# Altium footprint library 自建库.PcbLib: 169 footprints (part 11 of 11)
Each footprint in its own frame and in the unit in brackets; x right, y up, seen from the top. Pads: shape width x height; smd on the part's side, far side on the other; paste and mask are expansions set on the pad; w line width, h text height; cw(c..) or ccw(c..) is an arc to the next point about the centre after c.
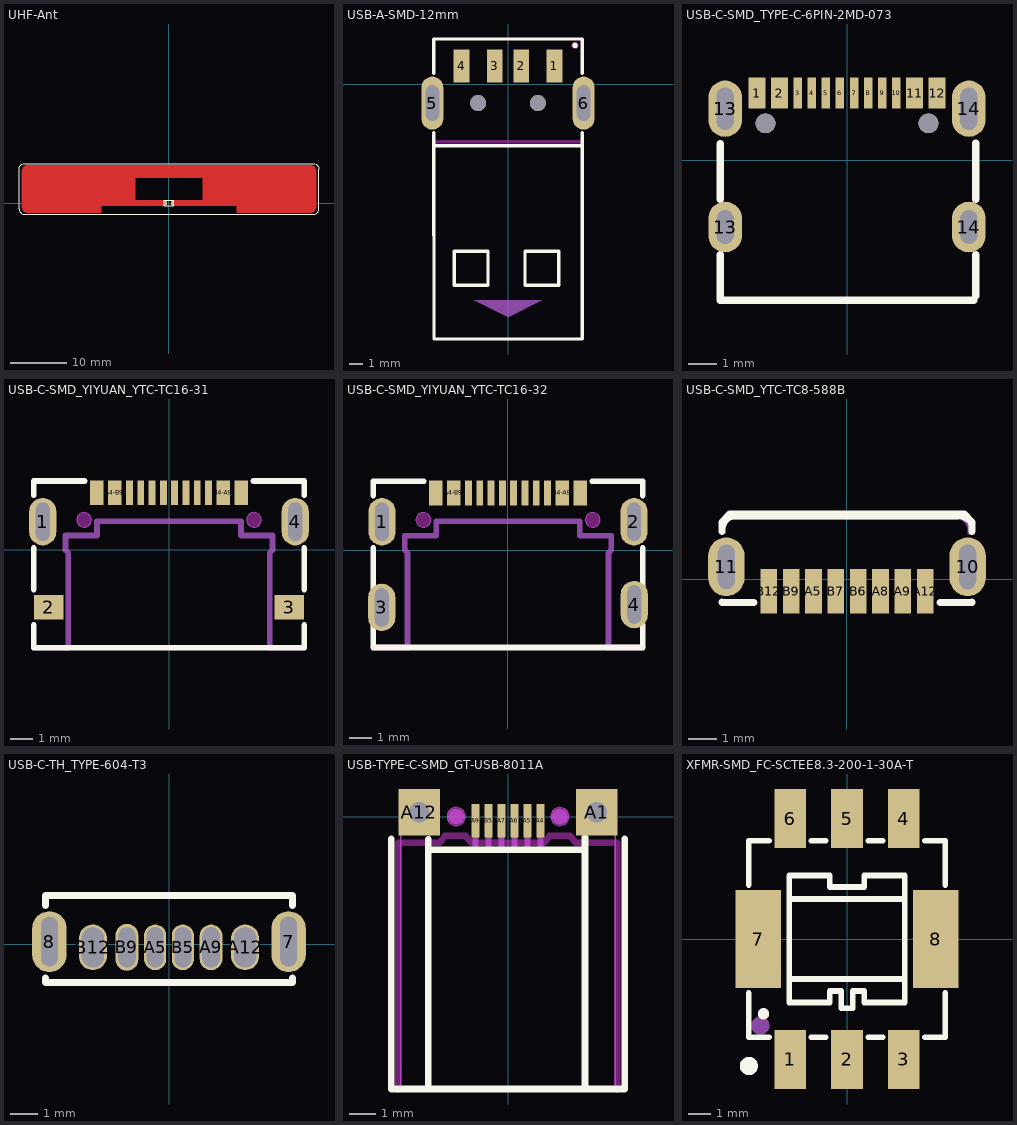
[diagram p10: the footprints below, top view; thin cyan lines are the x and y axes]

## UHF-Ant [mm] "超高频天线"
pads (2):
  oct 0.4x0.8 smd mask+0.102: 1(0.55,0)
  rect 0.4x0.8 smd mask+0.102: 2(-0.55,0)
Top Layer:
  region: 25.259,6.666 25.5,6.566 25.707,6.407 25.866,6.2 25.966,5.959 26,5.7 26,-0.7 25.966,-0.959 25.866,-1.2 25.707,-1.407 25.5,-1.566 25.259,-1.666 25,-1.7 12,-1.7 12,-0.5 0.4,-0.5 0.4,0.5 6,0.5 6,4.5 -6,4.5 -6,0.5 -0.4,0.5 -0.4,-0.5 -12,-0.5 -12,-1.7 -25,-1.7 -25.259,-1.666 -25.5,-1.566 -25.707,-1.407 -25.866,-1.2 -25.966,-0.959 -26,-0.7 -26,5.7 -25.966,5.959 -25.866,6.2 -25.707,6.407 -25.5,6.566 -25.259,6.666 -25,6.7 25,6.7 hole: 9,4.5 8.5,4.5 8.5,0.5 9,0.5 hole: 8,4.5 7.5,4.5 7.5,0.5 8,0.5 hole: 7,4.5 6.5,4.5 6.5,0.5 7,0.5 hole: -6.5,4.5 -7,4.5 -7,0.5 -6.5,0.5 hole: -7.5,4.5 -8,4.5 -8,0.5 -7.5,0.5 hole: -8.5,4.5 -9,4.5 -9,0.5 -8.5,0.5
  pour cut-out: 8.5,0.5 8.5,4.5 9,4.5 9,0.5
  pour cut-out: -7,0.5 -6.5,0.5 -6.5,4.5 -7,4.5
  pour cut-out: 7.5,0.5 8,0.5 8,4.5 7.5,4.5
  pour cut-out: 6.5,0.5 7,0.5 7,4.5 6.5,4.5
  pour cut-out: -9,0.5 -9,4.5 -8.5,4.5 -8.5,0.5
  pour cut-out: -8,0.5 -7.5,0.5 -7.5,4.5 -8,4.5
Top Overlay:
  lines w0: -26.5,-1 -26.466,-1.259 -26.366,-1.5 -26.207,-1.707 -26,-1.866 -25.759,-1.966 -25.5,-2 25.5,-2 25.759,-1.966 26,-1.866 26.207,-1.707 26.366,-1.5 26.466,-1.259 26.5,-1 26.5,6 26.466,6.259 26.366,6.5 26.207,6.707 26,6.866 25.759,6.966 25.5,7 -25.5,7 -25.759,6.966 -26,6.866 -26.207,6.707 -26.366,6.5 -26.466,6.259 -26.5,6 -26.5,-1 ; -0.8,-0.5 -0.8,0.5 0.8,0.5 0.8,-0.5 -0.8,-0.5
  lines w0.05: -0.8,-0.5 -0.8,0.5 0.8,0.5 0.8,-0.5 -0.8,-0.5

## USB-A-SMD-12mm [mm] "USB-A-公头"
pads (8):
  rect 1.2x2.5 smd: 1(3.5,1.4) 2(1,1.4) 3(-1,1.4) 4(-3.5,1.4)
  oval 1.65x4 hole 1 slot 2.7 at 90 deg: 5(-5.7,-1.4) 6(5.7,-1.4)
  round 1.2 hole 1.2 unplated: ""(-2.25,-1.4) ""(2.25,-1.4)
Top Overlay:
  circle w0.254: c5.05,2.95 r0.071
  lines w0.254: -5.588,-3.625 -5.573,-19.18 5.603,-19.18 5.588,-3.625 ; -5.588,0.825 -5.588,3.429 5.588,3.429 5.588,0.825 ; -5.587,-4.613 5.589,-4.613 ; -4.049,-15.116 -4.049,-12.576 -1.509,-12.576 -1.509,-15.116 -4.049,-15.116 ; 1.285,-15.116 1.285,-12.576 3.825,-12.576 3.825,-15.116 1.285,-15.116
Top Paste:
  drawing of 6 lines, arcs and shapes, not listed
Keep-Out Layer:
  lines w0.254: -5.588,-4.318 5.588,-4.318
Mechanical 15:
  circle w0.254: c5.05,2.95 r0.127
  region: -2.54,-16.256 2.54,-16.256 0,-17.526
3D body "USB_A.STEP": height 1.5, standoff -3, extent -6.031,-18.944 5.969,-0.614

## USB-C-SMD_TYPE-C-6PIN-2MD-073 [mm] "Type-c母座，C2765186"
pads (18):
  rect 0.6x1.1 smd: 1(-3.2,2.375) 2(-2.4,2.375) 11(2.4,2.375) 12(3.2,2.375)
  rect 0.3x1.1 smd: 3(-1.75,2.375) 4(-1.25,2.375) 5(-0.75,2.375) 6(-0.25,2.375) 7(0.25,2.375) 8(0.75,2.375) 9(1.25,2.375) 10(1.75,2.375)
  oval 1.2x1.8 hole 0.6 slot 1.2 at 90 deg: 13(-4.325,-2.375) 14(4.325,-2.375)
  oval 1.2x2 hole 0.6 slot 1.5 at 90 deg: 13(-4.325,1.825) 14(4.325,1.825)
  round 0.7 hole 0.7 unplated: ""(-2.89,1.305) ""(2.89,1.305)
Top Overlay:
  lines w0.254: -4.5,-3.356 -4.5,-4.975 4.5,-4.975 ; -4.5,-1.394 -4.5,0.594 ; 4.572,-4.826 4.572,-3.353 ; 4.572,-1.397 4.572,0.597
Top Paste:
  drawing of 16 lines, arcs and shapes, not listed
Mechanical 15:
  circle w0.25: c-2.89,1.305 r0.125
  circle w0.25: c2.89,1.305 r0.125
3D body "首韩type-c.stp": height 3.26, standoff -0.9, extent -4.47,-4.99 4.47,2.59

## USB-C-SMD_YIYUAN_YTC-TC16-31 [mil] "USB-C-母座"
pads (16):
  oval 47.24x82.7 hole 23.6 slot 66.9 at 90 deg mask+1.97: 1(-219.5,49.2) 4(219.5,49.2)
  rect 51.2x43.3 smd mask+1.97: 2(-209.4,-99.6) 3(209.4,-99.6)
  rect 23.6x43.3 smd mask+1.97: A1-B12(-126,99.6) A4-B9(-94.5,99.6) B1-A12(126,99.6) B4-A9(94.5,99.6)
  rect 11.8x43.3 smd mask+1.97: A5(-49.2,99.6) A6(-9.8,99.6) A7(9.8,99.6) A8(49.2,99.6) B5(68.9,99.6) B6(29.5,99.6) B7(-29.5,99.6) B8(-68.9,99.6)
Top Overlay:
  lines w10: -235,-130.4 -235,-170 235,-170 235,-130.4 ; -235,-68.9 -235,3.3 ; -235,95.1 -235,120 -146.9,120 ; 146.9,120 235,120 235,95.1 ; 235,-68.9 235,3.3
Keep-Out Layer:
  board cut-out: 160.4,52.4 160.4,54.95 158.45,59.65 154.85,63.25 150.15,65.2 145.05,65.2 140.35,63.25 136.75,59.65 134.8,54.95 134.8,52.4 134.8,49.85 136.75,45.15 140.35,41.55 145.05,39.6 150.15,39.6 154.85,41.55 158.45,45.15 160.4,49.85 160.4,52.4
  board cut-out: -134.8,52.4 -134.8,54.95 -136.75,59.65 -140.35,63.25 -145.05,65.2 -150.15,65.2 -154.85,63.25 -158.45,59.65 -160.4,54.95 -160.4,52.4 -160.4,49.85 -158.45,45.15 -154.85,41.55 -150.15,39.6 -145.05,39.6 -140.35,41.55 -136.75,45.15 -134.8,49.85 -134.8,52.4
Mechanical 1:
  circle w0.2: c147.6,52.4 r12.8
  circle w0.2: c-147.6,52.4 r12.8
  lines w10: -180,0 -180,25 ; -180,0 -175,-5 ; -180,0 -180,25 ; -180,0 -175,-5 ; -180,25 -125,25 ; -180,25 -125,25 ; -175,-170 -175,-5 ; -175,-170 -235,-170 -175,-170 ; -175,-170 -175,-5 ; -125,25 -125,50 ; -125,25 -125,50 ; -125,50 125,50 ; -125,50 125,50 ; 125,25 180,25 ; 125,25 125,50 ; 125,25 180,25 ; 125,25 125,50 ; 175,-170 235,-170 175,-170 ; 175,-170 175,-5 ; 175,-170 175,-5 ; 175,-5 180,0 ; 175,-5 180,0 ; 180,0 180,25 ; 180,0 180,25
3D body "U262-161N-4BFC10.stp": height 163.78, standoff -70.87, extent -214.96,-189.37 200,139.37

## USB-C-SMD_YIYUAN_YTC-TC16-32 [mil] "USB-C-母座"
pads (16):
  oval 47.24x82.7 hole 23.6 slot 66.9 at 90 deg mask+1.97: 1(-219.5,49.2) 2(219.5,49.2) 3(-220,-100) 4(220,-95)
  rect 23.6x43.3 smd mask+1.97: A1-B12(-126,99.6) A4-B9(-94.5,99.6) B1-A12(126,99.6) B4-A9(94.5,99.6)
  rect 11.8x43.3 smd mask+1.97: A5(-49.2,99.6) A6(-9.8,99.6) A7(9.8,99.6) A8(49.2,99.6) B5(68.9,99.6) B6(29.5,99.6) B7(-29.5,99.6) B8(-68.9,99.6)
Top Overlay:
  lines w10: -235,-130.4 -235,-170 235,-170 235,-130.4 ; -235,-68.9 -235,3.3 ; -235,95.1 -235,120 -146.9,120 ; 146.9,120 235,120 235,95.1 ; 235,-68.9 235,3.3
Keep-Out Layer:
  board cut-out: -134.8,52.4 -134.8,54.95 -136.75,59.65 -140.35,63.25 -145.05,65.2 -150.15,65.2 -154.85,63.25 -158.45,59.65 -160.4,54.95 -160.4,52.4 -160.4,49.85 -158.45,45.15 -154.85,41.55 -150.15,39.6 -145.05,39.6 -140.35,41.55 -136.75,45.15 -134.8,49.85 -134.8,52.4
  board cut-out: 160.4,52.4 160.4,54.95 158.45,59.65 154.85,63.25 150.15,65.2 145.05,65.2 140.35,63.25 136.75,59.65 134.8,54.95 134.8,52.4 134.8,49.85 136.75,45.15 140.35,41.55 145.05,39.6 150.15,39.6 154.85,41.55 158.45,45.15 160.4,49.85 160.4,52.4
Mechanical 1:
  circle w0.2: c-147.6,52.4 r12.8
  circle w0.2: c147.6,52.4 r12.8
  lines w10: -180,0 -175,-5 ; -180,0 -180,25 ; -180,0 -175,-5 ; -180,0 -180,25 ; -180,25 -125,25 ; -180,25 -125,25 ; -175,-170 -235,-170 -175,-170 ; -175,-170 -175,-5 ; -175,-170 -175,-5 ; -125,25 -125,50 ; -125,25 -125,50 ; -125,50 125,50 ; -125,50 125,50 ; 125,25 125,50 ; 125,25 180,25 ; 125,25 125,50 ; 125,25 180,25 ; 175,-170 175,-5 ; 175,-170 235,-170 175,-170 ; 175,-170 175,-5 ; 175,-5 180,0 ; 175,-5 180,0 ; 180,0 180,25 ; 180,0 180,25
3D body "U262-161N-4BFC10.stp": height 163.78, standoff -70.87, extent -214.96,-189.37 200,139.37

## USB-C-SMD_YTC-TC8-588B [mm] "Type-c 母座立贴贴片"
pads (10):
  oval 1.3x2.1 hole 0.6 slot 1.6 at 90 deg: 10(4.32,0.44) 11(-4.32,0.44)
  rect 0.6x1.6 smd: A5(-1.2,-0.44) A8(1.2,-0.44) A9(2,-0.44) A12(2.8,-0.44) B6(0.4,-0.44) B7(-0.4,-0.44) B9(-2,-0.44) B12(-2.8,-0.44)
Top Overlay:
  region: 4.4,1.6 4.4,1.75 4.392,1.828 4.333,1.972 4.222,2.083 4.078,2.142 4,2.15 -4,2.15 -4.068,2.143 -4.194,2.091 -4.291,1.994 -4.343,1.868 -4.35,1.8 -4.35,1.65 -4.5,1.65 -4.5,1.95 -4.5,2.02 -4.447,2.148 -4.348,2.247 -4.22,2.3 -4.15,2.3 4.1,2.3 4.19,2.3 4.355,2.231 4.482,2.105 4.55,1.939 4.55,1.85 4.55,1.6
  lines w0.254: -4.47,-0.84 -4.47,-0.827 ; -4.47,1.707 -4.47,2.04 -4.2,2.32 4.2,2.32 4.47,2.04 4.47,1.707 ; -4.4,-0.84 -3.331,-0.84 ; 3.331,-0.84 4.47,-0.84 4.47,-0.827
Top Paste:
  region: -4.87,0.94 -4.87,1.049 -4.786,1.252 -4.632,1.406 -4.429,1.49 -4.211,1.49 -4.008,1.406 -3.854,1.252 -3.77,1.049 -3.77,0.94 -3.77,-0.06 -3.77,-0.169 -3.854,-0.372 -4.008,-0.526 -4.211,-0.61 -4.429,-0.61 -4.632,-0.526 -4.786,-0.372 -4.87,-0.169 -4.87,-0.06
  region: 3.77,0.94 3.77,1.049 3.854,1.252 4.009,1.406 4.211,1.49 4.429,1.49 4.632,1.406 4.786,1.252 4.87,1.049 4.87,0.94 4.87,-0.06 4.87,-0.169 4.786,-0.372 4.632,-0.526 4.429,-0.61 4.211,-0.61 4.009,-0.526 3.854,-0.372 3.77,-0.169 3.77,-0.06
  region: -3.1,0.36 -2.5,0.36 -2.5,-1.24 -3.1,-1.24
  region: -2.3,0.36 -1.7,0.36 -1.7,-1.24 -2.3,-1.24
  region: -1.5,0.36 -0.9,0.36 -0.9,-1.24 -1.5,-1.24
  region: -0.7,0.36 -0.1,0.36 -0.1,-1.24 -0.7,-1.24
  region: 0.1,0.36 0.7,0.36 0.7,-1.24 0.1,-1.24
  region: 0.9,0.36 1.5,0.36 1.5,-1.24 0.9,-1.24
  region: 1.7,0.36 2.3,0.36 2.3,-1.24 1.7,-1.24
  region: 2.5,0.36 3.1,0.36 3.1,-1.24 2.5,-1.24
Mechanical 15:
  region: 4.325,1.6 4.325,1.75 4.317,1.828 4.258,1.972 4.147,2.083 4.003,2.142 3.925,2.15 -4.075,2.15 -4.143,2.143 -4.269,2.091 -4.366,1.994 -4.418,1.868 -4.425,1.8 -4.425,1.65 -4.575,1.65 -4.575,1.95 -4.575,2.02 -4.522,2.148 -4.423,2.247 -4.295,2.3 -4.225,2.3 4.025,2.3 4.115,2.3 4.28,2.231 4.407,2.105 4.475,1.939 4.475,1.85 4.475,1.6
3D body "TYPE_C.stp": height 6.6, standoff -1, extent -4.47,-0.84 4.47,2.32

## USB-C-TH_TYPE-604-T3 [mm] "Type-c 母座立贴直插"
pads (8):
  oval 1.25x2.2 hole 0.6 slot 1.8 at 90 deg: 7(4.32,0.103) 8(-4.32,0.103)
  oval 0.8x1.65 hole 0.6 slot 1.45 at 90 deg: A5(-0.5,-0.102) B5(0.5,-0.102)
  oval 0.82x1.65 hole 0.62 slot 1.45 at 90 deg: A9(1.52,-0.102)
  oval 1.02x1.65 hole 0.8 slot 1.45 at 90 deg: A12(2.75,-0.103) B12(-2.75,-0.103)
  oval 0.82x1.7 hole 0.62 slot 1.45 at 90 deg: B9(-1.52,-0.102)
Top Overlay:
  lines w0.254: -4.47,-1.213 -4.47,-1.382 4.47,-1.382 4.47,-1.213 ; -4.47,1.418 -4.47,1.778 4.47,1.778 4.47,1.418
3D body "TYPE_C.stp": height 6.6, standoff -1, extent -4.47,-1.382 4.47,1.778

## USB-TYPE-C-SMD_GT-USB-8011A [mm]
pads (8):
  rect 1.6x1.8 hole 0.8: A1(3.425,0.165) A12(-3.425,0.165)
  rect 0.3x1.29 smd: A4(1.25,-0.165) A5(0.75,-0.165) A6(0.25,-0.165) A7(-0.25,-0.165) A9(-1.25,-0.165) B5(-0.75,-0.165)
Top Overlay:
  lines w0.254: -4.5,-0.85 -4.5,-10.5 4.5,-10.5 4.5,-0.85 ; -3.07,-10.5 -3.07,-1.27 ; -3.07,-0.866 -3.07,-1.27 ; 2.97,-10.5 2.97,-1.27 ; 2.97,-0.79 2.97,-1.27 ; -3.07,-1.27 2.97,-1.27
Keep-Out Layer:
  board cut-out: 2.35,0.005 2.35,0.075 2.297,0.203 2.198,0.302 2.07,0.355 1.93,0.355 1.802,0.302 1.703,0.203 1.65,0.075 1.65,0.005 1.65,-0.065 1.703,-0.193 1.802,-0.292 1.93,-0.345 2.07,-0.345 2.198,-0.292 2.297,-0.193 2.35,-0.065 2.35,0.005
  board cut-out: -1.65,0.005 -1.65,0.075 -1.703,0.203 -1.802,0.302 -1.93,0.355 -2.07,0.355 -2.198,0.302 -2.297,0.203 -2.35,0.075 -2.35,0.005 -2.35,-0.065 -2.297,-0.193 -2.198,-0.292 -2.07,-0.345 -1.93,-0.345 -1.802,-0.292 -1.703,-0.193 -1.65,-0.065 -1.65,0.005
Keep-Out Layer:
  lines w0.254: -4.225,-1.005 -4.225,-10.5 -4.225,-1.005 ; -4.225,-1.005 -2.625,-1.005 ; -4.225,-1.005 -2.625,-1.005 ; -2.625,-1.005 -2.625,-1.005 ; -2.625,-1.005 -2.43,-0.745 ; -2.625,-1.005 -2.625,-1.005 ; -2.625,-1.005 -2.43,-0.745 ; -2.43,-0.745 -1.63,-0.745 ; -2.43,-0.745 -1.63,-0.745 ; -1.63,-0.745 -1.415,-1.005 ; -1.63,-0.745 -1.415,-1.005 ; -1.415,-1.005 -1.415,-1.005 ; -1.415,-1.005 1.405,-1.005 ; -1.415,-1.005 -1.415,-1.005 ; -1.415,-1.005 1.405,-1.005 ; 1.405,-1.005 1.6,-0.745 ; 1.405,-1.005 1.6,-0.745 ; 1.6,-0.745 2.4,-0.745 ; 1.6,-0.745 2.4,-0.745 ; 2.4,-0.745 2.615,-1.005 ; 2.4,-0.745 2.615,-1.005 ; 2.615,-1.005 4.215,-1.005 ; 2.615,-1.005 4.215,-1.005 ; 4.215,-1.005 4.215,-10.5 4.215,-1.005
Mechanical 1:
  circle w0.005: c2,0.005 r0.35
  circle w0.005: c-2,0.005 r0.35
Mechanical 6:
  circle w0.3: c2,0.005 r0.15
  circle w0.3: c-2,0.005 r0.15
Mechanical 15:
  region: 3.225,0.365 3.625,0.365 3.625,-0.035 3.225,-0.035
  region: -3.625,0.365 -3.225,0.365 -3.225,-0.035 -3.625,-0.035
  region: -1.35,0.005 -1.15,0.005 -1.15,-1.345 -1.35,-1.345
  region: -0.85,0.005 -0.65,0.005 -0.65,-1.345 -0.85,-1.345
  region: -0.35,0.005 -0.15,0.005 -0.15,-1.345 -0.35,-1.345
  region: 0.15,0.005 0.35,0.005 0.35,-1.345 0.15,-1.345
  region: 0.65,0.005 0.85,0.005 0.85,-1.345 0.65,-1.345
  region: 1.15,0.005 1.35,0.005 1.35,-1.345 1.15,-1.345
  region: 4.185,0.365 4.185,0.39 4.15,0.425 4.1,0.425 4.065,0.39 4.065,0.365 4.065,0.34 4.1,0.305 4.15,0.305 4.185,0.34 4.185,0.365
  lines w0.051: -4.125,-10.495 4.125,-10.495 4.125,0.005 3,0.005 3,-1.285 -3,-1.285 -3,0.005 -4.125,0.005 -4.125,-10.495
3D body "typec.stp": height 0.85, standoff -1.55, extent -3.975,-10.475 3.975,0.375

## XFMR-SMD_FC-SCTEE8.3-200-1-30A-T [mm]
pads (8):
  rect 1.4x2.6 smd paste+0 mask+0.05: 1(-2.5,-5.3) 2(0,-5.3) 3(2.5,-5.3) 4(2.5,5.3) 5(0,5.3) 6(-2.5,5.3)
  rect 2x4.3 smd paste+0 mask+0.05: 7(-3.9,0) 8(3.9,0)
Top Overlay:
  circle w0.25: c-3.674,-3.293 r0.125
  circle w0.4: c-4.318,-5.588 r0.2
  lines w0.254: -4.318,-2.381 -4.318,-4.318 -3.431,-4.318 ; -4.318,2.381 -4.318,4.318 -3.431,4.318 ; -2.54,-1.763 2.54,-1.763 ; -2.54,1.764 2.54,1.764 ; -1.569,-4.318 -0.931,-4.318 ; -1.569,4.318 -0.931,4.318 ; 0.931,-4.318 1.569,-4.318 ; 0.931,4.318 1.569,4.318 ; 3.431,-4.318 4.318,-4.318 4.318,-2.381 ; 3.431,4.318 4.318,4.318 4.318,2.381 ; -2.54,-2.794 -0.762,-2.794 -0.762,-2.286 -0.254,-2.286 -0.254,-3.048 0.254,-3.048 0.254,-2.286 0.762,-2.286 0.762,-2.794 2.54,-2.794 2.54,2.794 0.762,2.794 0.762,2.286 -0.762,2.286 -0.762,2.794 -2.54,2.794 -2.54,-2.794
Mechanical 15:
  circle w0.4: c-3.81,-3.81 r0.2
3D body "xfmr.stp": height 7.02, standoff 0, extent -4.5,-6 4.5,6